# Altium footprint library TarabusLib_KAP.PcbLib: 504 footprints (part 3 of 32)
Each footprint in its own frame and in the unit in brackets; x right, y up, seen from the top. Pads: shape width x height; smd on the part's side, far side on the other; paste and mask are expansions set on the pad; w line width, h text height; cw(c..) or ccw(c..) is an arc to the next point about the centre after c.
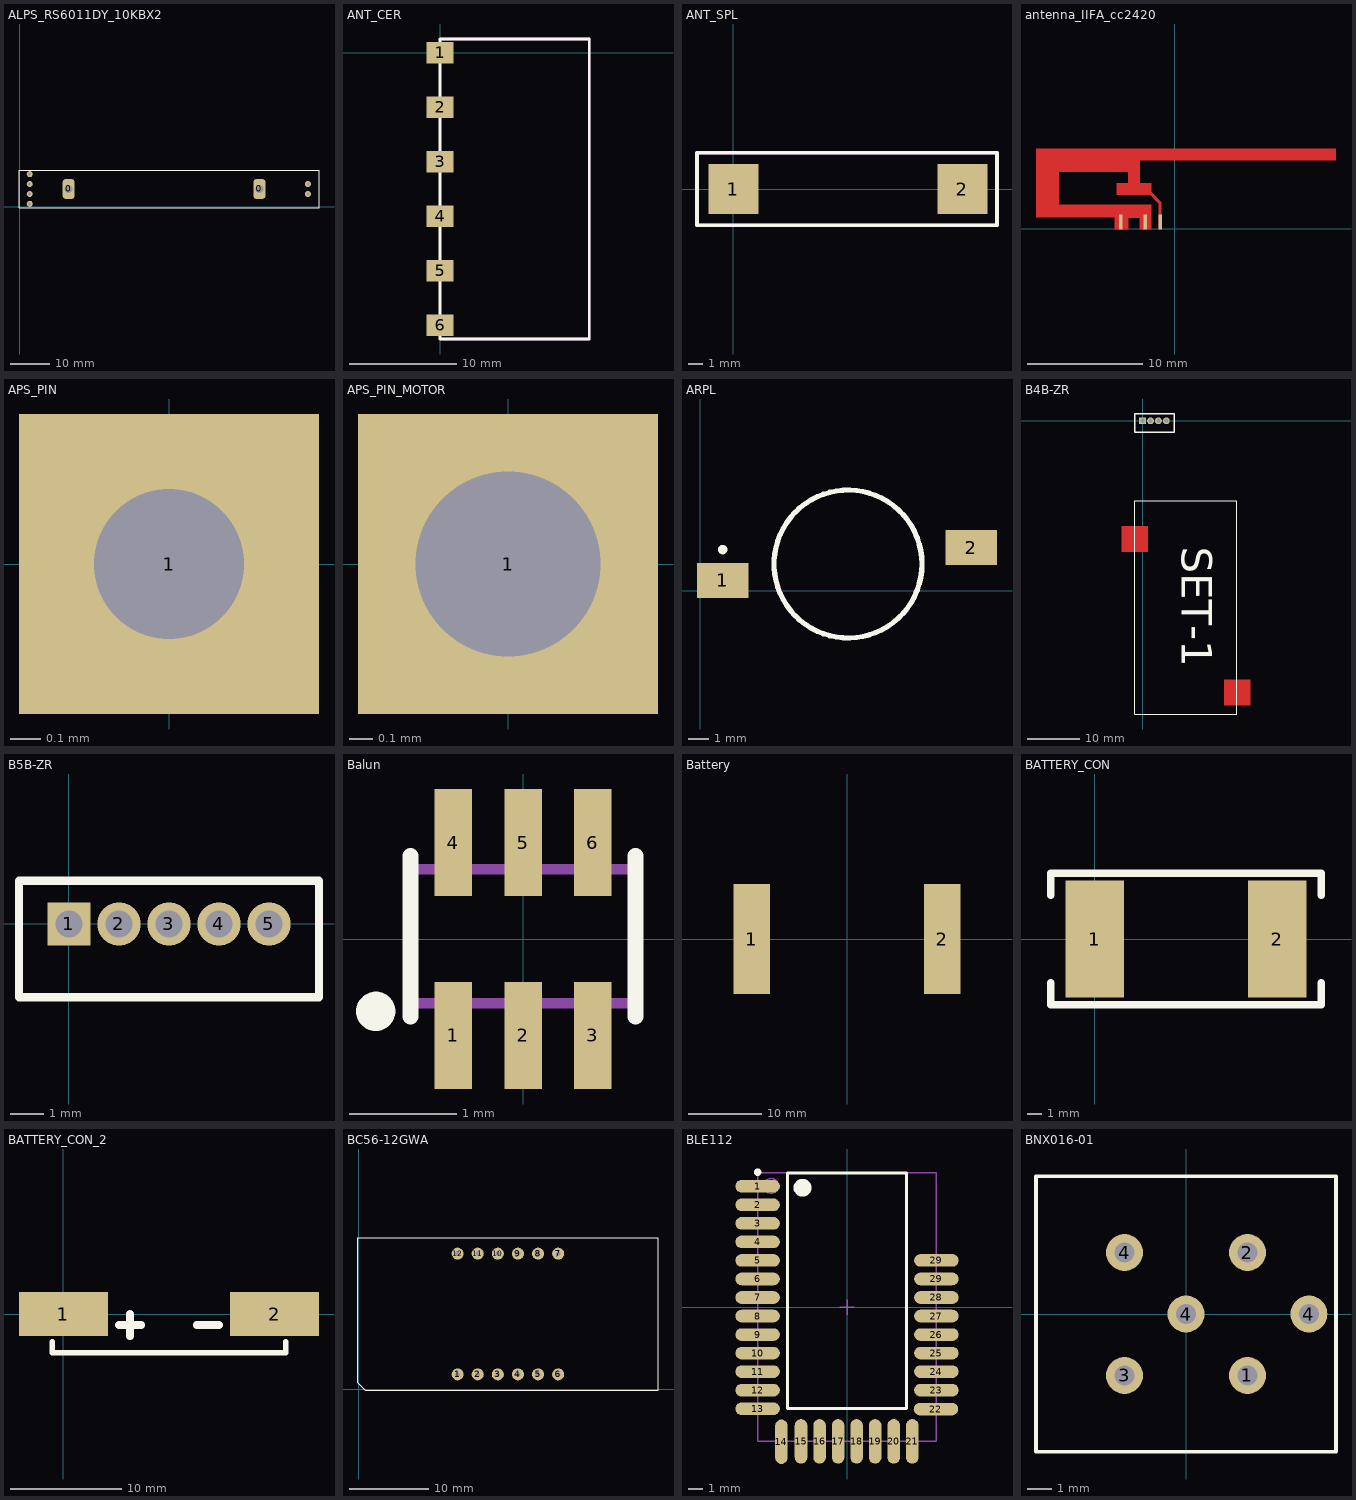
[diagram p2: the footprints below, top view; thin cyan lines are the x and y axes]

## ALPS_RS6011DY_10KBX2 [mm] "POTENTIOMETR"
pads (8):
  rrect50% 3x5 hole 2: 0(12.25,4.5) 0(60.25,4.5)
  round 1.524 hole 0.762: 1(2.45,3.25) 1(2.45,8.25) 2(2.45,0.75) 2(2.45,5.75) 3(72.45,3.25) 3(72.45,5.75)
Top Overlay:
  lines w0.1: -0.25,-0.25 75.25,-0.25 75.25,9.25 75,9.25 -0.25,9.25 -0.25,-0.25
3D body "ПРМ_ALPS RS6011DY 10KBX2  Ползунковый регулятор.STEP": height 7, standoff -3.7, extent 0,0 75,9

## ANT_CER [mm]
pads (6):
  rect 2.5x2 smd: 1(0,0) 2(0,-5.1) 3(0,-10.2) 4(0,-15.3) 5(0,-20.4) 6(0,-25.5)
Top Overlay:
  lines w0.254: 0,-26.77 13.97,-26.77 13.97,1.297 0,1.297 0,-26.77
Mechanical 7:
  lines w0.254: 0,-26.77 13.97,-26.77 13.97,1.297 0,1.297

## ANT_SPL [mm]
pads (2):
  rect 3.5x3.5 smd: 1(0,0) 2(16,0)
Top Overlay:
  lines w0.254: -2.54,-2.54 18.415,-2.54 18.415,2.54 -2.54,2.54 -2.54,-2.54
Mechanical 7:
  lines w0.254: -2.54,-2.54 18.415,-2.54 18.415,2.54 -2.54,2.54 -2.54,-2.54

## antenna_IIFA_cc2420 [mm]
pads (3):
  rect 0.3x1.3 smd paste-0.3 mask-0.3: 1(-1.27,0.584) 2(-2.565,0.584) 3(-4.674,0.584)
Top Layer:
  region: -1.397,2.134 -1.422,2.21 -2.261,3.048 -2.032,3.175 -1.143,2.286 -1.143,2.134
  region: -1.143,-0.076 -1.397,-0.076 -1.397,2.147 -1.143,2.147
  region: -2.03,-0.076 -3.03,-0.076 -3.03,0.924 -4.03,0.924 -4.03,-0.076 -5.18,-0.076 -5.18,0.991 -12.012,0.991 -12.012,6.924 13.97,6.924 13.97,5.924 -3.03,5.924 -3.03,3.924 -2.03,3.924 -2.03,2.924 -5.03,2.924 -5.03,3.924 -4.03,3.924 -4.03,4.924 -10.03,4.924 -10.03,2.057 -2.03,2.057

## APS_PIN [mm]
pads (1):
  rect 1x1 hole 0.5 mask+0: 1(0,0)

## APS_PIN_MOTOR [mm]
pads (1):
  rect 1.3x1.3 hole 0.8 mask+0: 1(0,0)

## ARPL [mm]
pads (2):
  rect 2.5x1.7 smd: 1(1.1,0.5) 2(13.2,2.1)
Top Overlay:
  circle w0.254: c7.2,1.3 r3.6
  circle w0.254: c1.1,2 r0.1

## B4B-ZR [mm]
pads (4):
  rect 1.3x1.3 hole 0.8 mask+0: 1(0,0)
  round 1.3 hole 0.8 mask+0: 2(1.5,0) 3(3,0) 4(4.5,0)
Top Layer:
  rectangle: 15.5,-54.2 20.5,-49.2
  rectangle: -4,-25 1,-20
Top Overlay:
  lines w0.15: -1.5,-55.8 -1.5,-15.2 17.9,-15.2 17.9,-55.8 -1.5,-55.8
  lines w0.254: -1.5,-2.2 -1.5,1.3 6,1.3 6,-2.2 -1.5,-2.2
  text "SET-1" at 5.5,-24 h10
3D body "BПЧ051 Rev.2.stp": height 5.9, standoff 0, extent -1.5,-55.8 17.9,-15.2
3D body: height 4.5, standoff -2.7, extent -1.55,-2.15 5.95,1.35

## B5B-ZR [mm]
pads (5):
  rect 1.3x1.3 hole 0.8 mask+0: 1(0,0)
  round 1.3 hole 0.8 mask+0: 2(1.5,0) 3(3,0) 4(4.5,0) 5(6,0)
Top Overlay:
  lines w0.254: -1.5,-2.2 -1.5,1.3 7.5,1.3 7.5,-2.2 -1.5,-2.2
3D body: height 4.5, standoff -2.7, extent -1.5,-2.15 7.5,1.35

## Balun [mm]
height 0.7
pads (6):
  rect 0.35x1 smd: 1(-0.65,-0.9) 2(0,-0.9) 3(0.65,-0.9) 4(-0.65,0.9) 5(0,0.9) 6(0.65,0.9)
Top Overlay:
  circle w0.254: c-1.375,-0.675 r0.056
  lines w0.15: -1.05,-0.725 -1.05,0.775 ; 1.05,-0.725 1.05,0.775
Mechanical 7:
  lines w0.1: -1.05,-0.6 1.05,-0.6 1.05,0.65 -1.05,0.65 -1.05,-0.6
Mechanical 10:
  text ".Designator" at -1.8,1.775 h0.8
  text ".Comment" at -0.925,-2.05 h0.6
3D body: height 0.55, standoff 0, extent -1.05,-0.6 1.05,0.65

## Battery [mm]
pads (2):
  rect 5x15 smd mask+0: 1(-13,0) 2(13,0)

## BATTERY_CON [mm]
pads (2):
  rect 4x8 smd: 1(0,0) 2(12.5,0)
Top Overlay:
  lines w0.5: -3,-3 -3,-4.5 15.5,-4.5 15.5,-3 ; -3,3 -3,4.5 15.5,4.5 15.5,3

## BATTERY_CON_2 [mm]
pads (2):
  rect 8x4 smd: 1(0,0) 2(19,0)
Top Overlay:
  lines w0.1: -1,-3.5 -1,-2.5
  lines w0.5: -1,-2.5 -1,-3.5 20,-3.5 20,-2.5
  lines w0.7: 5,-1 7,-1 ; 6,-2 6,0 ; 12,-1 14,-1

## BC56-12GWA [mm]
pads (12):
  round 1.524 hole 0.6: 1(12.45,1.875) 2(14.99,1.875) 3(17.53,1.875) 4(20.07,1.875) 5(22.61,1.875) 6(25.15,1.875) 7(25.15,17.125) 8(22.61,17.125) 9(20.07,17.125) 10(17.53,17.125) 11(14.99,17.125) 12(12.45,17.125)
Top Overlay:
  lines w0.1: -0.125,0.825 0.8,-0.1 0.825,-0.125 0.925,-0.125 37.6,-0.125 37.75,-0.125 37.75,0 37.75,19 37.75,19.125 37.625,19.125 0.025,19.125 -0.125,19.125 -0.125,19.1 -0.125,19 -0.125,0.925 -0.125,0.825
3D body: height 8.1, standoff -4, extent 0,0 37.6,19

## BLE112 [mm] "Module,28-Leads, Body 18,10x8,66mm, Pitch 1,25mm"
height 2.3
pads (30):
  oval 3x0.85 smd: 1(-6.025,8.15) 2(-6.025,6.9) 3(-6.025,5.65) 4(-6.025,4.4) 5(-6.025,3.15) 6(-6.025,1.9) 7(-6.025,0.65) 8(-6.025,-0.6) 9(-6.025,-1.85) 10(-6.025,-3.1) 11(-6.025,-4.35) 12(-6.025,-5.6) 13(-6.025,-6.85) 22(6,-6.875) 23(6.025,-5.6) 24(6.025,-4.35) 25(6.025,-3.1) 26(6.025,-1.85) 27(6.025,-0.6) 28(6.025,0.65) 29(6.025,1.9) 29(6.025,3.15)
  oval 0.85x3 smd: 14(-4.425,-9.075) 15(-3.1,-9.05) 16(-1.85,-9.05) 17(-0.6,-9.05) 18(0.65,-9.05) 19(1.9,-9.05) 20(3.15,-9.05) 21(4.4,-9.05)
Top Overlay:
  circle w0.25: c-6.025,9.1 r0.125
  circle w0.6: c-3,8.05 r0.3
  lines w0.2: -4,-6.825 -4,9.05 4,9.05 4,-6.825 -4,-6.825
Mechanical 7:
  lines w0.05: -6.025,-9.05 -6.025,9.05 6.025,9.05 6.025,-9.05 -6.025,-9.05
  lines w0.1: -0.5,0 0.5,0 ; 0,-0.5 0,0.5
Mechanical 9:
  circle w0.1: c-5.125,8.175 r0.5
  lines w0.1: -6.025,-9.05 -6.025,9.05 6.025,9.05 6.025,-9.05 -6.025,-9.05
3D body: height 2.3, standoff 0, extent -6.025,-9.05 6.025,9.05

## BNX016-01 [mm] "12x11x8"
height 8
pads (6):
  round 1.5 hole 0.8: 1(2.5,-2.5) 2(2.5,2.5) 3(-2.5,-2.5) 4(-2.5,2.5) 4(0,0) 4(5,0)
Top Overlay:
  lines w0.15: -6.1,-5.6 6.1,-5.6 6.1,5.6 -6.1,5.6 -6.1,-5.6
Mechanical 7:
  lines w0.1: -6.1,-5.6 -6.1,5.6 6.1,5.6 6.1,-5.6 -6.1,-5.6
3D body: height 8, standoff 0, extent -6,-5.5 6,5.5
3D body: height 2, standoff -2, extent 2.25,2.2 2.775,2.8
3D body: height 2, standoff -2, extent -2.75,2.2 -2.225,2.8
3D body: height 2, standoff -2, extent -0.25,-0.3 0.275,0.3
3D body: height 2, standoff -2, extent 4.75,-0.3 5.275,0.3
3D body: height 2, standoff -2, extent 2.25,-2.8 2.775,-2.2
3D body: height 2, standoff -2, extent -2.75,-2.8 -2.225,-2.2